# Altium footprint library myfirstproject_library.PcbLib: 36 footprints (part 1 of 3)
Each footprint in its own frame and in the unit in brackets; x right, y up, seen from the top. Pads: shape width x height; smd on the part's side, far side on the other; paste and mask are expansions set on the pad; w line width, h text height; cw(c..) or ccw(c..) is an arc to the next point about the centre after c.
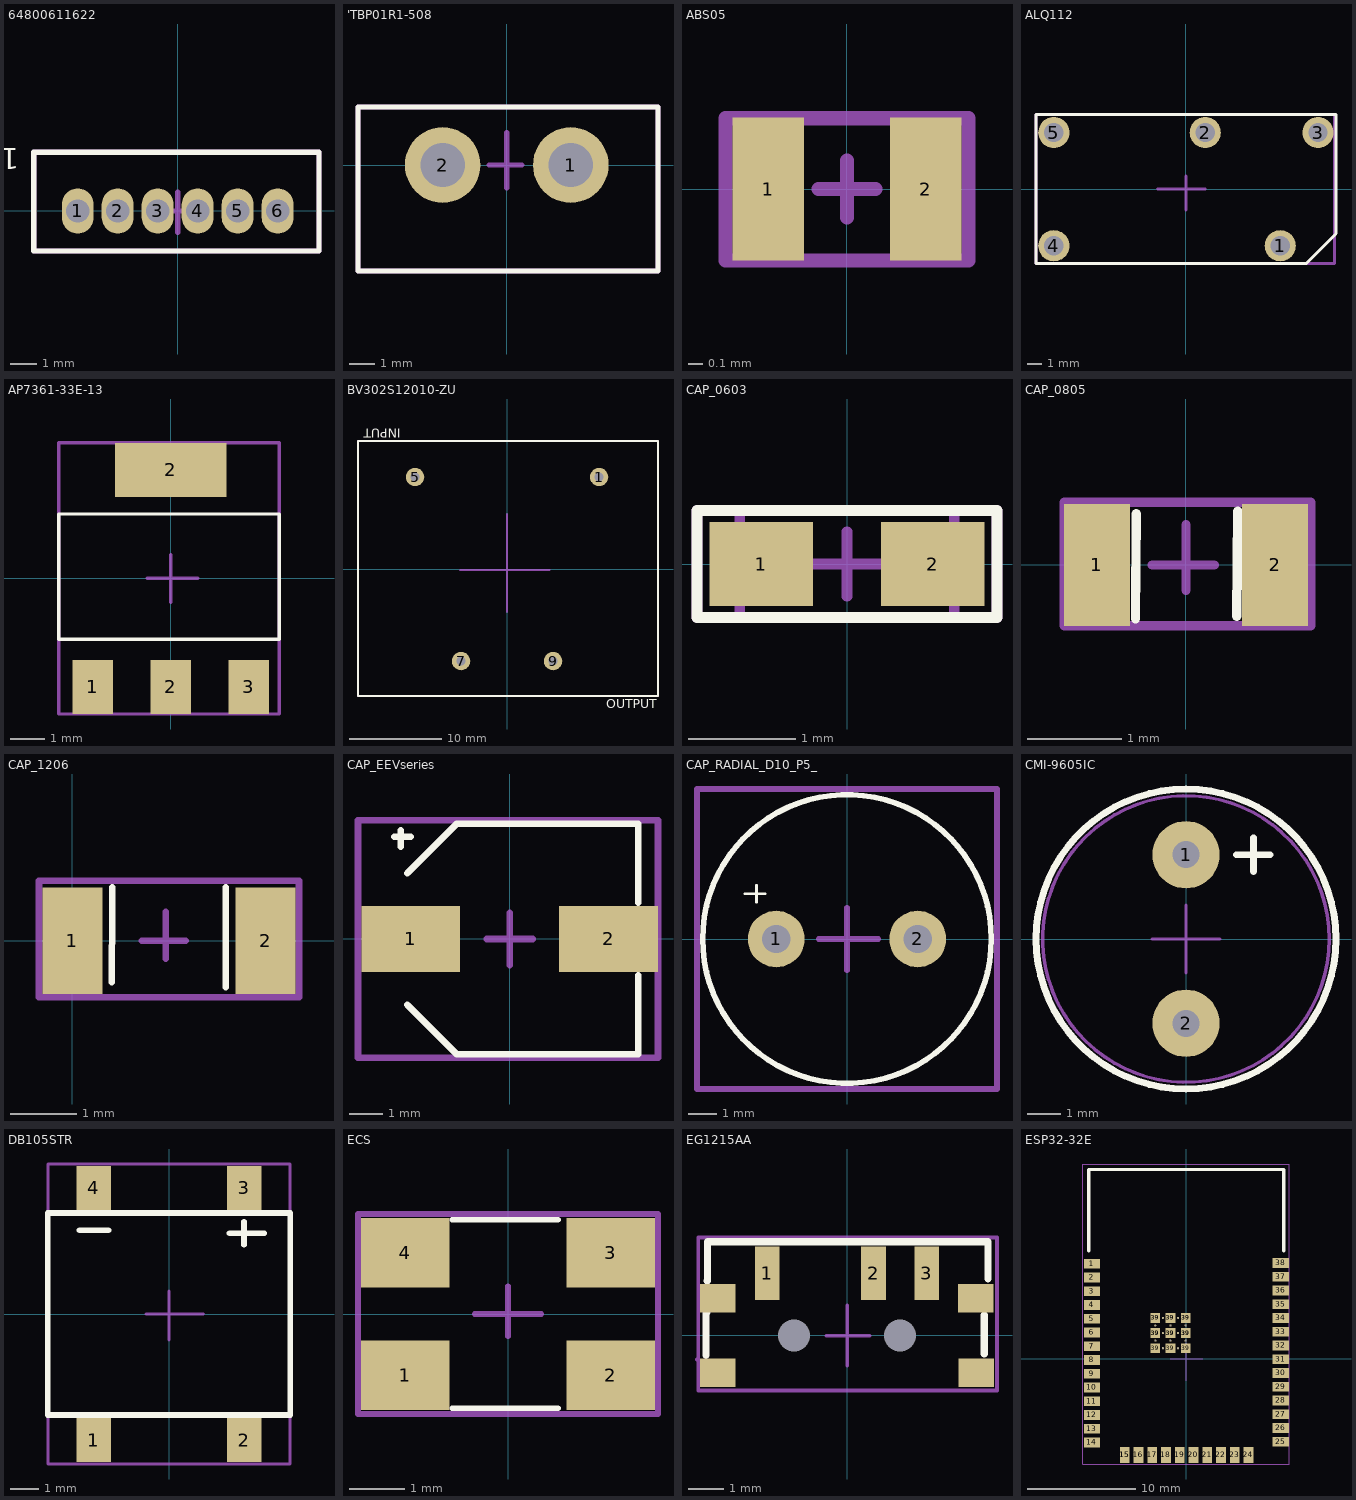
[diagram p0: the footprints below, top view; thin cyan lines are the x and y axes]

## 64800611622 [mm]
pads (6):
  oval 1.2x1.7 hole 0.87 mask+0.05: 1(-3.75,0) 2(-2.25,0) 3(-0.75,0) 4(0.75,0) 5(2.25,0) 6(3.75,0)
Top Overlay:
  lines w0.2: -5.4,-1.5 -5.4,1.5 -5.4,2.2 5.3,2.2 5.3,-1.5 -5.4,-1.5
  text "1" at -5.954,2.346 h0.8
Top Component Center:
  lines w0.2: -0.8,0 0.8,0 0,0 ; 0,0 0,0.7 0,-0.8 0,0 ; -5.4,-1.5 5.3,-1.5 5.3,2.2 -5.4,2.2 -5.4,1.5 -5.4,-1.5
Top Designator:
  lines w0.2: -5.4,-1.5 5.3,-1.5 5.3,2.2 -5.4,2.2 -5.4,1.5 -5.4,-1.5
  text ".Designator" at -0.746,0.721 h0.8
3D body "64800611622 (rev1).stp": height 4.55, standoff -2.65, extent -5.3,-1.4 5.2,2.1

## 'TBP01R1-508 [mm]
pads (2):
  round 3 hole 1.75 mask+0.05: 1(2.54,0) 2(-2.54,0)
Top Overlay:
  lines w0.2: -5.9,-4.2 -5.9,2.3 6,2.3 6,-4.2 -5.9,-4.2
Top Component Center:
  lines w0.2: -0.7,0 0.6,0 0,0 ; 0,0 0,1.3 0,-0.9 0,0 ; -5.9,-4.2 6,-4.2 6,2.3 -5.9,2.3 -5.9,-4.2
Top Designator:
  lines w0.2: -5.9,-4.2 -5.9,2.3 6,2.3 6,-4.2 -5.9,-4.2
  text ".Designator" at -1.046,-1.679 h0.8
3D body "CUI_DEVICES_TBP01R1-508-02BE.step": height 8.8, standoff -3.7, extent -5.84,-9.8 5.92,2.2

## ABS05 [mm]
pads (2):
  rect 0.5x1 smd mask+0.05: 1(-0.55,0) 2(0.55,0)
Top Component Center:
  lines w0.1: -0.2,0 0.2,0 0,0 0,-0.2 0,0.2 ; -0.85,-0.5 -0.85,0.494 -0.81,0.494 0.85,0.494 0.85,-0.5 -0.85,-0.5
Top Designator:
  lines w0.1: -0.85,-0.5 0.85,-0.5 0.85,0.494 -0.81,0.494 -0.85,0.494 -0.85,-0.5
  text ".Designator" at -0.5,-0.2 h0.6
3D body "ABS05-32.768KHZ-T--3DModel-STEP-400430.STEP": height 0.5, standoff 0, extent -0.811,-0.474 0.789,0.526

## ALQ112 [mm]
pads (5):
  round 2.1 hole 1.3 mask+0.05: 1(6.35,-3.81) 2(1.3,3.81) 3(8.89,3.81) 4(-8.89,-3.81) 5(-8.89,3.81)
Top Overlay:
  lines w0.2: -10.04,5.01 -10.09,5.01 ; -10.09,5.01 -10.09,-4.99 8.11,-4.99 10.1,-3 10.1,5.01 -9.99,5.01 -10.09,5.01
Top Component Center:
  lines w0.2: -10.04,5.01 -10.09,5.01 ; -1.9,0 0,0 1.3,0 ; 0,-1.4 0,0.9 ; -10.09,5.01 -10.09,-4.99 10.01,-4.99 10.01,5.01 -9.99,5.01 -10.09,5.01
Top Designator:
  lines w0.2: -10.04,5.01 -10.09,5.01 ; -10.09,5.01 -10.09,-4.99 10.01,-4.99 10.01,5.01 -9.99,5.01 -10.09,5.01
  text ".Designator" at -1.146,0.862 h1.52
3D body: height 1.27, standoff -4, extent 5.95,-3.96 6.75,-3.66
3D body: height 1.27, standoff -4, extent 8.49,3.66 9.29,3.96
3D body: height 1.27, standoff -4, extent 0.87,3.66 1.67,3.96
3D body: height 1.27, standoff 0, extent -9.29,3.66 -8.49,3.96
3D body: height 1.27, standoff 0, extent -1.27,3.81 -1.27,3.81
3D body: height 0.45, standoff -3.75, extent -9.287,-4.209 -8.49,-3.411
3D body: height 0.45, standoff -3.75, extent -9.287,3.411 -8.49,4.209
3D body: height 1.5, standoff 0, extent 3.11,1.81 3.11,1.81
3D body: height 1.5, standoff 0, extent 2.11,0.81 2.11,0.81
3D body: height 1.5, standoff 0, extent 0.11,11.81 0.11,11.81
3D body: height 15.6, standoff 0.4, extent -10,-5 10,5
3D body: height 1.5, standoff 0, extent -8.89,3.81 -8.89,3.81

## AP7361-33E-13 [mm]
pads (4):
  rect 1.2x1.6 smd mask+0.05: 1(-2.3,-3.2) 2(0,-3.2) 3(2.3,-3.2)
  rect 3.3x1.6 smd mask+0.05: 2(0,3.2)
Top Overlay:
  lines w0.1: -3.2,-1.8 3.2,-1.8 3.2,1.9 -3.3,1.9 -3.3,-1.797 -3.2,-1.797
Top Component Center:
  lines w0.1: -0.7,0 0.8,0 0,0 ; 0,0 0,0.7 0,-0.7 0,0 ; -3.3,-4 3.2,-4 3.2,4 -3.3,4 -3.3,-4
Top Designator:
  lines w0.1: -3.3,-4 -3.3,4 3.2,4 3.2,-4 -3.3,-4
  text ".Designator" at -1.446,0.762 h1.52
3D body "SOT-223.step": height 1.65, standoff -0.03, extent -3.25,-3.48 3.25,3.48

## BV302S12010-ZU [mm]
pads (4):
  round 2 hole 1 mask+0.05: 1(10,10) 5(-10,10) 7(-5,-10) 9(5,-10)
Top Overlay:
  lines w0.2: -16.2,-13.8 16.4,-13.8 16.4,13.9 -16.2,13.9 -16.2,-13.8
  text "INPUT" at -11.554,15.246 h1
  text "OUTPUT" at 10.754,-15.146 h1
Top Component Center:
  lines w0.2: -5.1,-0.1 4.6,-0.1 0,-0.1 0,-4.7 0,6 0,0 ; -16.2,-13.8 16.4,-13.8 16.4,13.9 -16.2,13.9 -16.2,-13.8
Top Designator:
  lines w0.2: -16.2,-13.8 16.4,-13.8 16.4,13.9 -16.2,13.9 -16.2,-13.8
  text ".Designator" at -1.846,2.52 h2
3D body "BV302S 2902.step": height 21.8, standoff -4.5, extent -16.15,-13.75 16.35,13.75

## CAP_0603 [mil]
pads (2):
  rect 38x31 smd mask+1.97: 1(-31.5,0) 2(31.5,0)
Top Overlay:
  lines w3.94: -55.12,-19.68 -55.12,19.68 55.12,19.68 55.12,-19.68 -55.12,-19.68
Top 3D Body:
  lines w3.94: -39.37,-19.68 -39.37,19.68 39.37,19.68 39.37,-19.68 -39.37,-19.68
Top Component Center:
  lines w3.94: -11.81,0 11.81,0 ; 0,-11.81 0,11.81 ; -55.12,-19.68 -55.12,19.68 55.12,19.68 55.12,-19.68 -55.12,-19.68
Top Designator:
  lines w3.94: -55.12,-19.68 -55.12,19.68 55.12,19.68 55.12,-19.68 -55.12,-19.68
  text ".Designator" at -11.81,-7.88 h23.62
3D body "CAPC0603.STEP": height 31.5, standoff 0, extent -41.35,-22.22 41.35,18.28

## CAP_0805 [mm]
pads (2):
  rect 0.7x1.3 smd mask+0.05: 1(-0.95,0) 2(0.95,0)
Top Overlay:
  lines w0.1: -0.539,-0.573 -0.529,0.547 ; 0.541,-0.548 0.551,0.572
Top Component Center:
  lines w0.1: -1.3,-0.65 1.33,-0.65 1.33,0.67 -1.3,0.67 -1.3,-0.63 ; -0.36,0 0.3,0 0,0 ; 0,0 0,-0.27 0,0.43 0,0
Top Designator:
  lines w0.1: -1.3,-0.65 1.33,-0.65 1.33,0.67 -1.3,0.67 -1.3,-0.63
  text ".Designator" at -0.7,-0.233 h0.5
3D body "CAPC0805.STEP": height 0.9, standoff 0, extent -1.301,-0.578 1.301,0.778

## CAP_1206 [mm]
pads (2):
  rect 0.9x1.6 smd mask+0.05: 1(0,0) 2(2.9,0)
Top Overlay:
  lines w0.1: 0.59,-0.62 0.6,0.5 0.6,0.8 ; 2.3,-0.7 2.3,-0.32 2.3,0.8
Top Component Center:
  lines w0.1: 1.04,0 1.7,0 1.4,0 ; 1.4,0 1.4,-0.27 1.4,0.43 1.4,0 ; -0.5,-0.85 0.1,-0.85 2.73,-0.85 3.4,-0.85 3.4,-0.65 3.4,0.9 -0.5,0.9 -0.5,-0.63 -0.5,-0.85
Top Designator:
  lines w0.1: -0.5,-0.85 0.1,-0.85 2.73,-0.85 3.4,-0.85 3.4,-0.65 3.4,0.9 -0.5,0.9 -0.5,-0.63 -0.5,-0.85
  text ".Designator" at 0.9,-0.133 h0.5
3D body "CAPC1206.STEP": height 1.3, standoff -0.01, extent -0.529,-0.866 3.42,1.086

## CAP_EEVseries [mm]
pads (2):
  rect 3x2 smd mask+0.05: 1(-3,0) 2(3,0)
Top Overlay:
  lines w0.2: -3.5,3.1 -3,3.1 ; -3.3,2.8 -3.3,3.3 ; -3.1,-2 -1.6,-3.5 3.9,-3.5 3.9,-1.1 ; -3.1,2 -1.6,3.5 3.9,3.5 3.9,1.1
Top Component Center:
  lines w0.2: -0.7,0 0.7,0 0,0 0,0.8 0,-0.8 0,-0.002 -0.002,-0.002 ; -4.6,-3.6 -4.6,0.4 -4.6,3.6 4.5,3.6 4.5,-3.6 -4.6,-3.6
Top Designator:
  lines w0.2: -4.6,-3.6 4.5,-3.6 4.5,3.6 -4.6,3.6 -4.6,0.4 -4.6,-3.6
  text ".Designator" at -0.746,1.221 h0.8
3D body "EEV686M035A9HAA.step": height 8.01, standoff 0, extent -3.6,-3.4 4,3.4

## CAP_RADIAL_D10_P5_ [mm]
pads (2):
  round 2 hole 1 mask+0.05: 1(-2.5,0) 2(2.5,0)
Top Overlay:
  circle w0.2: c0,0 r5.1
  lines w0.1: -3.6,1.6 -2.9,1.6 ; -3.2,1.3 -3.2,1.9
Top Component Center:
  lines w0.2: 0,-1.1 0,0 ; 0,1.1 0,0 ; 0,0 1.1,0 -1,0 0,0 ; -5.3,-5.3 5.3,-5.3 5.3,5.3 -5.3,5.3 -5.3,-5.3
Top Designator:
  lines w0.2: -5.3,-5.3 5.3,-5.3 5.3,5.3 -5.3,5.3 -5.3,-5.3
  text ".Designator" at 0,0.567 h0.8
3D body "ESH477M050AH4AA (1).step": height 22.21, standoff -19.8, extent -5.25,-5.3 5.25,5.2

## CMI-9605IC [mm]
pads (2):
  round 2 hole 0.8 mask+0.05: 1(0,2.5) 2(0,-2.5)
Top Overlay:
  circle w0.2: c0,0 r4.45
  lines w0.2: 1.5,2.5 2.5,2.5 ; 2,2 2,3
Top Component Center:
  circle w0.1: c0,0 r4.25
  lines w0.1: -1,0 1,0 ; 0,-1 0,1 0,0
Top Designator:
  circle w0.1: c0,0 r4.25
  text ".Designator" at -0.746,0.262 h1.52
3D body: height 5.1, standoff 0.1, extent -4.3,-4.297 4.3,4.297
3D body: height 5, standoff 0, extent 0,2.5 0,2.5
3D body: height 5, standoff 0, extent 0,2.5 0,2.5
3D body: height 5, standoff 0, extent 0,2.5 0,2.5
3D body: height 0.15, standoff -5.35, extent -0.298,2.201 0.3,2.799
3D body: height 1.65, standoff -3.85, extent -0.298,-2.799 0.3,-2.201
3D body: height 5.2, standoff 5.15, extent -4,-4 4,3.994

## DB105STR [mm]
pads (4):
  rect 1.2x1.52 smd mask+0.05: 1(-2.61,-4.37) 2(2.61,-4.37) 3(2.61,4.37) 4(-2.61,4.37)
Top Overlay:
  lines w0.2: -3.1,2.9 -2.1,2.9 ; 2.1,2.8 3.3,2.8 2.6,2.8 2.6,3.2 2.6,2.4 ; -4.2,-3.5 4.2,-3.5 4.2,3.5 -4.2,3.5 -4.2,-3.5
Top Component Center:
  lines w0.1: -0.8,0 1.2,0 ; 0,-0.9 0,0.8 ; -4.2,-5.2 4.2,-5.2 4.2,5.2 -4.2,5.2 -4.2,-5.2
Top Designator:
  lines w0.1: -4.2,-5.2 -4.2,5.2 4.2,5.2 4.2,-5.2 -4.2,-5.2
  text ".Designator" at -2.246,0.562 h1.52
3D body "DB107S  DB-S.step": height 2.66, standoff 0, extent -4.16,-5.2 4.16,5.2

## ECS [mm]
pads (4):
  rect 1.6x1.25 smd mask+0.05: 1(-1.85,-1.1) 2(1.85,-1.1) 3(1.85,1.1) 4(-1.85,1.1)
Top Overlay:
  lines w0.1: -1,-1.7 0.9,-1.7 ; -1,1.7 0.9,1.7
Top Component Center:
  lines w0.1: -0.6,0 0.6,0 0,0 ; 0,0 0,0.5 0,-0.4 0,0 ; -2.7,-1.8 -2.7,1.8 2.7,1.8 2.7,-1.8 -2.7,-1.8
Top Designator:
  lines w0.1: -2.7,-1.8 2.7,-1.8 2.7,1.8 -2.7,1.8 -2.7,-1.8
  text ".Designator" at -0.8,0.1 h0.6
3D body "ECS-160-20-30B-TR.STEP": height 0.85, standoff 0, extent -2.5,-1.6 2.5,1.6

## EG1215AA [mm]
pads (9):
  rect 0.7x1.5 smd mask+0.05: 1(-2.25,1.75) 2(0.75,1.75) 3(2.25,1.75)
  rect 1x0.8 smd mask+0.05: ""(-3.65,-1.05) ""(-3.65,1.05) ""(3.63,1.05) ""(3.65,-1.05)
  round 0 hole 0.9 mask+0.05: ""(-1.5,0) ""(1.5,0)
Top Overlay:
  lines w0.2: -3.98,-0.56 -3.98,0.64 -3.95,0.64 ; -3.95,1.54 -3.93,1.54 -3.93,2.64 3.98,2.64 3.98,1.59 ; 3.86,0.58 3.87,0.58 3.87,-0.52
Top Component Center:
  lines w0.1: -4.23,-0.685 -4.2,-0.685 ; -0.59,-0.005 0.01,-0.005 0.64,-0.005 ; 0.01,-0.86 0.01,0.85 0.01,0.01 ; -4.2,-0.685 -4.2,2.755 4.23,2.755 4.23,-0.645 4.23,-1.565 -4.2,-1.565 -4.2,-0.685
Top Designator:
  lines w0.1: -4.23,-0.67 -4.2,-0.67 ; -4.2,-0.67 -4.2,-1.55 4.23,-1.55 4.23,-0.63 4.23,2.77 -4.2,2.77 -4.2,-0.67
  text ".Designator" at -0.506,0.292 h1.52
3D body "EG1215AA--3DModel-STEP-1.STEP": height 1.4, standoff -0.3, extent -3.88,-2.71 3.82,2.19

## ESP32-32E [mm]
pads (69):
  rect 1.5x0.9 smd mask+0.05: 1(-8.71,8.796) 2(-8.71,7.526) 3(-8.71,6.256) 4(-8.71,4.986) 5(-8.71,3.716) 6(-8.71,2.446) 7(-8.71,1.176) 8(-8.71,-0.094) 9(-8.71,-1.364) 10(-8.71,-2.634) 11(-8.71,-3.904) 12(-8.71,-5.174) 13(-8.71,-6.444) 14(-8.71,-7.714) 25(8.71,-7.645) 26(8.71,-6.375) 27(8.71,-5.105) 28(8.71,-3.835) 29(8.71,-2.565) 30(8.71,-1.295) 31(8.71,-0.025) 32(8.71,1.245) 33(8.71,2.515) 34(8.71,3.785) 35(8.71,5.055) 36(8.71,6.325) 37(8.71,7.595) 38(8.71,8.865)
  rect 0.9x1.5 smd mask+0.05: 15(-5.689,-8.864) 15(-5.689,-8.864) 16(-4.419,-8.864) 17(-3.149,-8.864) 18(-1.879,-8.864) 19(-0.609,-8.864) 20(0.661,-8.864) 21(1.931,-8.864) 22(3.201,-8.864) 23(4.471,-8.864) 24(5.741,-8.864)
  rect 0.9x0.9 smd mask+0.05: 39(-2.86,0.99) 39(-2.86,2.39) 39(-2.86,2.39) 39(-2.86,2.39) 39(-2.86,3.79) 39(-2.86,3.79) 39(-1.46,0.99) 39(-1.46,2.39) 39(-1.46,2.39) 39(-1.46,2.39) 39(-1.46,3.79) 39(-1.46,3.79) 39(-0.06,0.99) 39(-0.06,2.39) 39(-0.06,2.39) 39(-0.06,2.39) 39(-0.06,3.79) 39(-0.06,3.79)
  round 0.2 hole 0.1 mask+0.05: 39(-2.86,1.69) 39(-2.86,3.09) 39(-2.16,0.99) 39(-2.16,2.39) 39(-2.16,3.79) 39(-1.46,1.69) 39(-1.46,3.09) 39(-0.76,0.99) 39(-0.76,2.39) 39(-0.76,3.79) 39(-0.06,1.69) 39(-0.06,3.09)
Top Overlay:
  lines w0.3: -9,10 -9,17.5 9,17.5 9,10
Top Component Center:
  lines w0.1: -1.5,0 1.5,0 0,0 ; 0,-2 0,0 ; 0,1.5 0,0 ; -9.556,-9.702 -9.556,11.5 -9.556,18 -9.5,18 9.5,18 9.5,-9.702 -9.556,-9.702
Top Designator:
  lines w0.1: -9.556,-9.702 9.5,-9.702 9.5,18 -9.5,18 -9.556,18 -9.556,11.5 -9.556,-9.702
  text ".Designator" at -1.746,1.262 h1.52
3D body "ESP32-WROOM-32E.step": height 3.45, standoff 0, extent -9,-9.17 9,16.33